# Altium footprint library EXPLORER.PcbLib: 252 footprints (part 8 of 16)
Each footprint in its own frame and in the unit in brackets; x right, y up, seen from the top. Pads: shape width x height; smd on the part's side, far side on the other; paste and mask are expansions set on the pad; w line width, h text height; cw(c..) or ccw(c..) is an arc to the next point about the centre after c.
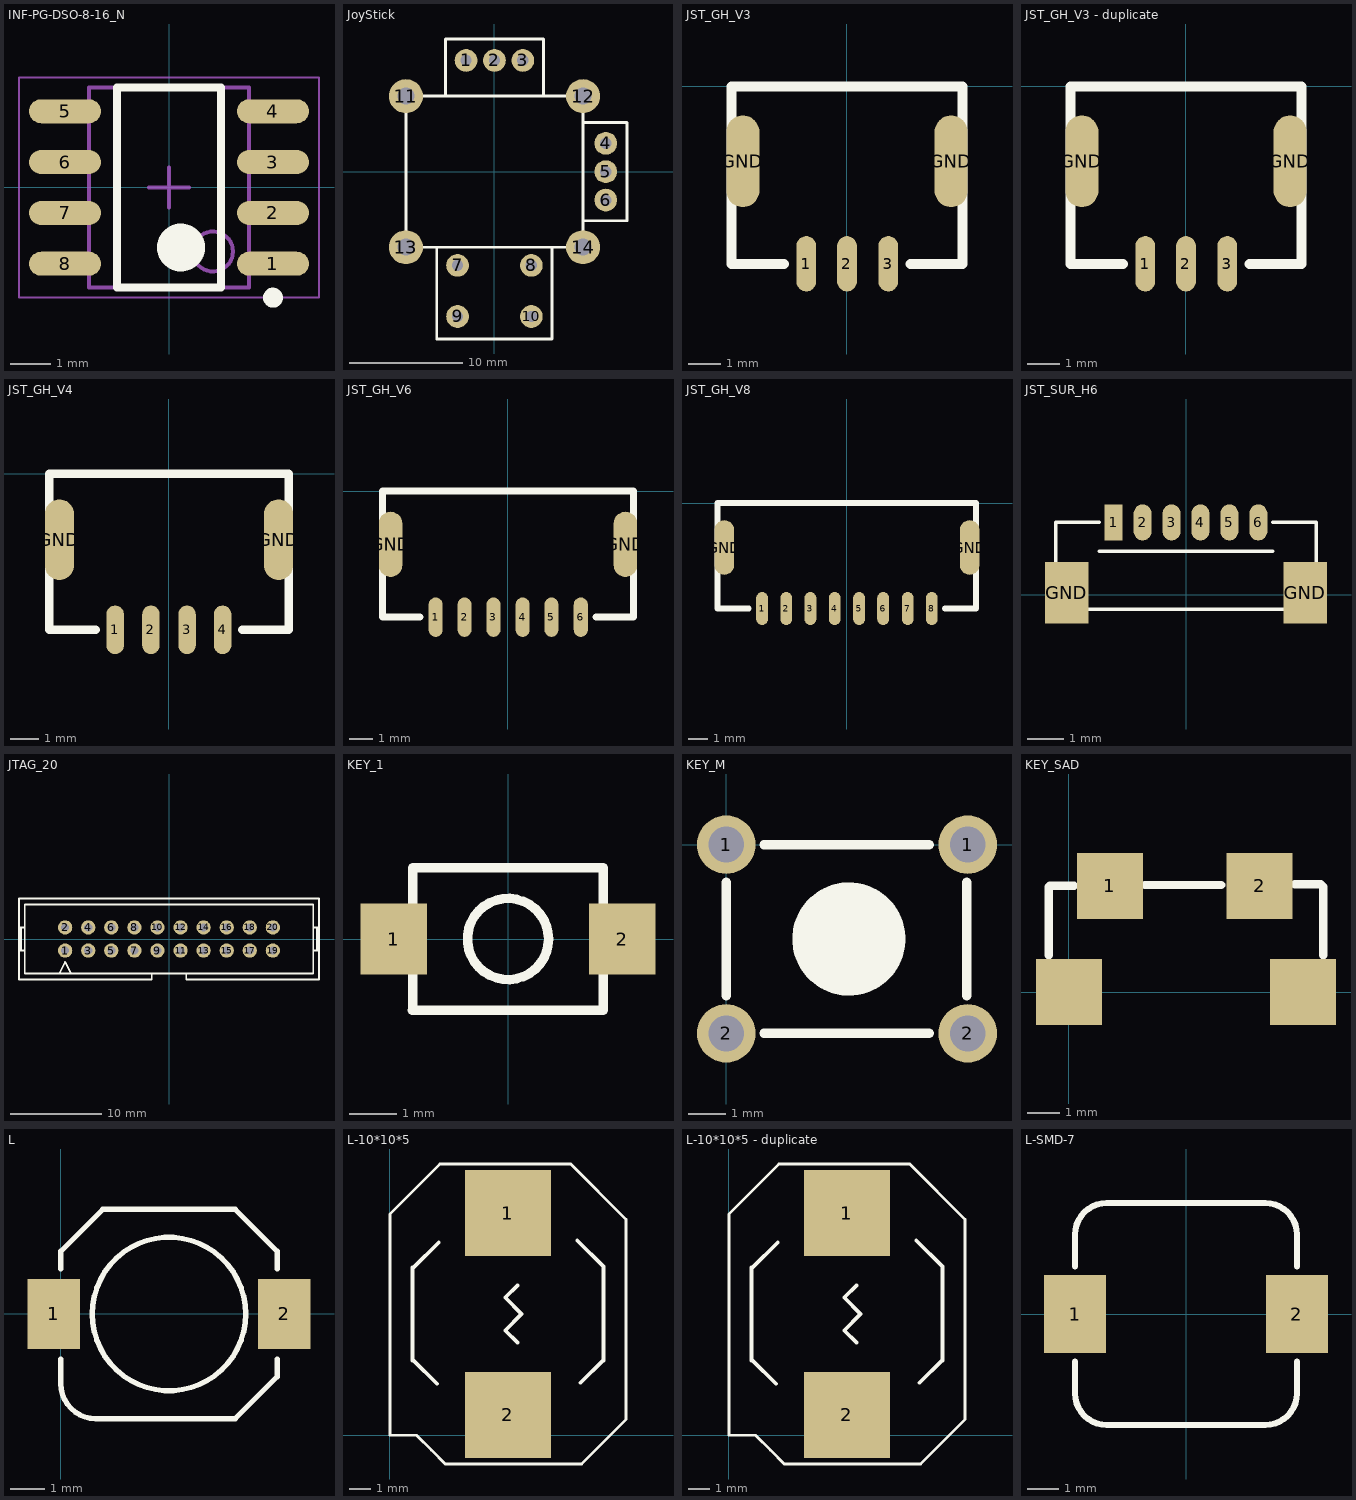
[diagram p7: the footprints below, top view; thin cyan lines are the x and y axes]

## INF-PG-DSO-8-16_N [mm] "SOP, 8-Leads, Body 4.9x3.9mm, Pitch 1.27mm, IPC Medium Density"
height 1.75
pads (8):
  oval 1.8x0.6 smd: 1(2.6,-1.905) 2(2.6,-0.635) 3(2.6,0.635) 4(2.6,1.905) 5(-2.6,1.905) 6(-2.6,0.635) 7(-2.6,-0.635) 8(-2.6,-1.905)
Top Overlay:
  circle w0.6: c0.3,-1.5 r0.3
  circle w0.25: c2.6,-2.755 r0.125
  lines w0.2: -1.3,-2.5 1.3,-2.5 1.3,2.5 -1.3,2.5 -1.3,-2.5
Mechanical 13:
  circle w0.1: c1.1,-1.6 r0.5
  lines w0.1: -2,-2.5 2,-2.5 2,2.5 -2,2.5 -2,-2.5
Mechanical 15:
  lines w0.05: -3.75,-2.75 3.75,-2.75 3.75,2.75 -3.75,2.75 -3.75,-2.75
  lines w0.1: -0.5,0 0.5,0 ; 0,-0.5 0,0.5
3D body: height 1.75, standoff 0.11, extent -2,-2.5 2,2.5

## JoyStick [mm] "Ä£Ä"
height 20
pads (14):
  round 2 hole 1: 1(-2.5,9.8) 2(0,9.8) 3(2.5,9.8) 4(9.8,2.5) 5(9.8,0) 6(9.8,-2.5) 7(-3.25,-8.25) 8(3.25,-8.25) 9(-3.25,-12.75) 10(3.25,-12.75)
  round 3 hole 1.5: 11(-7.8,6.65) 12(7.8,6.65) 13(-7.8,-6.65) 14(7.8,-6.65)
Top Overlay:
  lines w0.254: -5.08,-6.65 -5.08,-14.732 5.08,-14.732 5.08,-6.65 ; -4.318,6.65 -4.318,11.684 4.318,11.684 4.318,6.65 ; 7.8,-4.318 11.684,-4.318 11.684,4.318 7.8,4.318 ; -7.8,-6.65 -7.8,6.65 7.8,6.65 7.8,-6.65 -7.8,-6.65

## JST_GH_V3 [mil]
pads (5):
  rrect100% 24x67 smd: 1(-49.21,-214.57) 2(0,-214.57) 3(50,-214.57)
  rrect100% 40x111 smd: GND(-125.98,-90.55) GND(126,-90.55)
Top Overlay:
  lines w12: -76.18,-214.57 -139.76,-214.57 -139.76,0 140,0 140,-214.57 77,-214.57
  text "." at -70,-225 h155
3D body: height 164.56, standoff -0.8, extent -137.59,-234.88 138,-40

## JST_GH_V3 - duplicate [mil]
pads (5):
  rrect100% 24x67 smd: 1(-49.21,-214.57) 2(0,-214.57) 3(50,-214.57)
  rrect100% 40x111 smd: GND(-125.98,-90.55) GND(126,-90.55)
Top Overlay:
  lines w12: -76.18,-214.57 -139.76,-214.57 -139.76,0 140,0 140,-214.57 77,-214.57
  text "." at -70,-225 h155
3D body: height 164.56, standoff -0.8, extent -137.59,-234.88 138,-40

## JST_GH_V4 [mil]
pads (6):
  rrect100% 24x67 smd: 1(-73.82,-214.57) 2(-24.61,-214.57) 3(25,-214.57) 4(74,-214.57)
  rrect100% 40x111 smd: GND(-150.59,-90.55) GND(151,-90.55)
Top Overlay:
  lines w12: -100.79,-214.57 -164.37,-214.57 -164.37,0 165,0 165,-214.57 101,-214.57
  text "." at -95,-225 h155
3D body: height 164.56, standoff -0.8, extent -161.8,-235.21 163,-40.33

## JST_GH_V6 [mil]
pads (8):
  rrect100% 24x67 smd: 1(-123.03,-214.57) 2(-73.82,-214.57) 3(-24.61,-214.57) 4(25,-214.57) 5(74,-214.57) 6(124,-214.57)
  rrect100% 40x111 smd: GND(-199.8,-90.55) GND(200,-90.55)
Top Overlay:
  lines w12: -150,-214.57 -213.58,-214.57 -213.58,0 214,0 214,-214.57 150,-214.57
  text "." at -145,-225 h155
3D body: height 164.56, standoff -0.8, extent -211.61,-231.88 211.61,-37

## JST_GH_V8 [mil]
pads (10):
  rrect100% 24x67 smd: 1(-172.24,-214.57) 2(-123.03,-214.57) 3(-73.82,-214.57) 4(-24.61,-214.57) 5(25,-214.57) 6(74,-214.57) 7(124,-214.57) 8(173,-214.57)
  rrect100% 40x111 smd: GND(-249.02,-90.55) GND(250,-90.55)
Top Overlay:
  lines w12: -199.21,-214.57 -262.8,-214.57 -262.8,0 263,0 263,-214.57 200,-214.57
  text "." at -195,-225 h155
3D body: height 164.56, standoff -0.8, extent -260.65,-233.88 261,-39

## JST_SUR_H6 [mm]
pads (8):
  rect 0.5x1 smd: 1(-2,2)
  rrect100% 0.5x1 smd: 2(-1.2,2) 3(-0.4,2) 4(0.4,2) 5(1.2,2) 6(2,2)
  rect 1.2x1.7 smd: GND(-3.3,0.05) GND(3.3,0.05)
Top Overlay:
  lines w0.1: -2.4,1.2 2.4,1.2 ; -2.4,2 -3.6,2 -3.6,-0.4 3.6,-0.4 3.6,2 2.4,2
  text "." at -2.4,2.8 h0.7
3D body: height 1.7, standoff -0.05, extent -3.5,-0.4 3.5,2.3

## JTAG_20 [mil]
pads (20):
  round 62 hole 35: 1(-450,-50) 2(-450,50) 3(-350,-50) 4(-350,50) 5(-250,-50) 6(-250,50) 7(-150,-50) 8(-150,50) 9(-50,-50) 10(-50,50) 11(50,-50) 12(50,50) 13(150,-50) 14(150,50) 15(250,-50) 16(250,50) 17(350,-50) 18(350,50) 19(450,-50) 20(450,50)
Top Overlay:
  lines w8: -650,-50 -625,-50 ; -650,50 -625,50 ; -641.67,-50 -641.67,50 ; -475,-150 -450,-100 -425,-150 ; -339.57,-175 -75,-175 -75,-150 ; -325,-175 -650,-175 -650,175 650,175 650,-175 325,-175 75,-175 75,-150 ; 625,-50 650,-50 ; 625,50 650,50 ; 641.67,-50 641.67,50 ; -75,-150 75,-150 ; -75,-150 -625,-150 -625,150 625,150 625,-150 75,-150

## KEY_1 [mm]
pads (2):
  rect 1.4x1.5 smd: 1(-2.4,0) 2(2.4,0)
Top Overlay:
  circle w0.2: c0,0 r0.852
  lines w0.2: -2.008,-1.5 2,-1.5 2,1.5 -2,1.5 -2,-1.492

## KEY_M [mil]
pads (4):
  round 62 hole 38: 1(0,0) 1(255.91,0) 2(0,-200) 2(255.91,-200)
Top Overlay:
  circle w60: c130,-100 r30
  lines w10: -0.03,-160 -0.03,-40 ; 39.97,-200 215,-200 ; 39.97,0 215,0 ; 255,-160 255,-40

## KEY_SAD [mm]
pads (4):
  rect 2x2 smd: 1(1.245,3.226) 2(5.791,3.226) ""(0,0) ""(7.112,0)
Top Overlay:
  lines w0.254: -0.61,1.118 -0.61,3.2 ; -0.584,3.226 0.152,3.226 ; 2.311,3.251 4.623,3.251 ; 6.858,3.277 7.645,3.277 7.722,3.2 7.722,1.118

## L [mm]
pads (2):
  rect 1.5x2 smd: 1(-0.2,0) 2(6.4,0)
Top Overlay:
  circle w0.152: c3.1,0 r2.2
  lines w0.152: 0,-1.3 0,-2 ccw(c1,-2) 1,-3 5,-3 6.2,-1.8 6.2,-1.3 ; 0,1.3 0,1.8 1.2,3 5,3 6.2,1.8 6.2,1.3
3D body: height 2.77, standoff 0.01, extent 0.08,-3 6.15,3

## L-10*10*5 [mm] "ÌùÆ"
height 6
pads (2):
  rect 4x4 smd: 1(5.5,10.347) 2(5.5,0.947)
Top Overlay:
  lines w0.127: 1.934,-0.694 1.241,0 0,0 0,1.08 0,10.307 2.325,12.632 8.421,12.632 11,10.053 11,0.733 8.929,-1.338 7.735,-1.338 3.366,-1.338 2.579,-1.338 ; 1.934,-0.694 2.579,-1.338 ; 1.934,-0.694 2.579,-1.338
  lines w0.178: 2.198,2.395 1.106,3.488 1.055,3.488 1.055,7.806 1.106,7.806 2.274,8.974 ; 5.944,4.313 5.373,4.885 6.135,5.647 5.373,6.409 5.944,6.98 ; 8.726,9.076 9.945,7.856 9.945,7.806 9.945,3.488 9.92,3.488 8.878,2.446
3D body: height 0.4, standoff 0, extent 4.941,1.964 6.008,2.649
3D body: height 0.4, standoff 0, extent 4.992,8.542 6.059,9.203
3D body: height 0.6, standoff 0, extent 2.709,2.596 8.697,8.572
3D body: height 2.6, standoff 0.6, extent 3.115,3.16 8.106,8.14
3D body: height 3.2, standoff 2.6, extent 2.709,2.596 8.697,8.572
3D body: height 0.5, standoff 0, extent 4.509,-0.449 6.745,0.211
3D body: height 0.5, standoff 0, extent 4.433,11.108 6.668,11.768
3D body: height 5.1, standoff 0, extent 4.433,9.66 6.668,11.108
3D body: height 5.1, standoff 0, extent 4.509,0.211 6.745,1.659
3D body: height 5.1, standoff 4.8, extent 1.514,1.667 9.482,9.651
3D body: height 5, standoff 0, extent 0.499,0.696 10.504,10.675
3D body: height 5.2, standoff 4.8, extent 2.002,2.128 8.975,9.114

## L-10*10*5 - duplicate [mm] "ÌùÆ"
height 6
pads (2):
  rect 4x4 smd: 1(5.5,10.347) 2(5.5,0.947)
Top Overlay:
  lines w0.127: 1.934,-0.694 2.579,-1.338 ; 1.934,-0.694 2.579,-1.338 ; 1.934,-0.694 1.241,0 0,0 0,1.08 0,10.307 2.325,12.632 8.421,12.632 11,10.053 11,0.733 8.929,-1.338 7.735,-1.338 3.366,-1.338 2.579,-1.338
  lines w0.178: 2.198,2.395 1.106,3.488 1.055,3.488 1.055,7.806 1.106,7.806 2.274,8.974 ; 5.944,4.313 5.373,4.885 6.135,5.647 5.373,6.409 5.944,6.98 ; 8.726,9.076 9.945,7.856 9.945,7.806 9.945,3.488 9.92,3.488 8.878,2.446
3D body: height 5.2, standoff 4.8, extent 2.002,2.128 8.975,9.114
3D body: height 5, standoff 0, extent 0.499,0.696 10.504,10.675
3D body: height 5.1, standoff 4.8, extent 1.514,1.667 9.482,9.651
3D body: height 5.1, standoff 0, extent 4.509,0.211 6.745,1.659
3D body: height 5.1, standoff 0, extent 4.433,9.66 6.668,11.108
3D body: height 0.5, standoff 0, extent 4.433,11.108 6.668,11.768
3D body: height 0.5, standoff 0, extent 4.509,-0.449 6.745,0.211
3D body: height 3.2, standoff 2.6, extent 2.709,2.596 8.697,8.572
3D body: height 2.6, standoff 0.6, extent 3.115,3.16 8.106,8.14
3D body: height 0.6, standoff 0, extent 2.709,2.596 8.697,8.572
3D body: height 0.4, standoff 0, extent 4.992,8.542 6.059,9.203
3D body: height 0.4, standoff 0, extent 4.941,1.964 6.008,2.649

## L-SMD-7 [mm] "贴片电感7*7"
pads (2):
  rect 2x2.5 smd: 1(-3.556,0) 2(3.556,0)
Top Overlay:
  lines w0.2: -3.556,-1.524 -3.556,-2.54 ccw(c-2.54,-2.54) -2.54,-3.556 2.54,-3.556 ccw(c2.54,-2.54) 3.556,-2.54 3.556,-1.524 ; -3.556,1.524 -3.556,2.54 cw(c-2.54,2.54) -2.54,3.556 2.54,3.556 cw(c2.54,2.54) 3.556,2.54 3.556,1.524
3D body: height 4, standoff 0, extent -3.556,-3.556 3.556,3.556